# Altium schematic symbol library MCU_Microchip_ATmega.SchLib: 440 symbols (part 5 of 7)
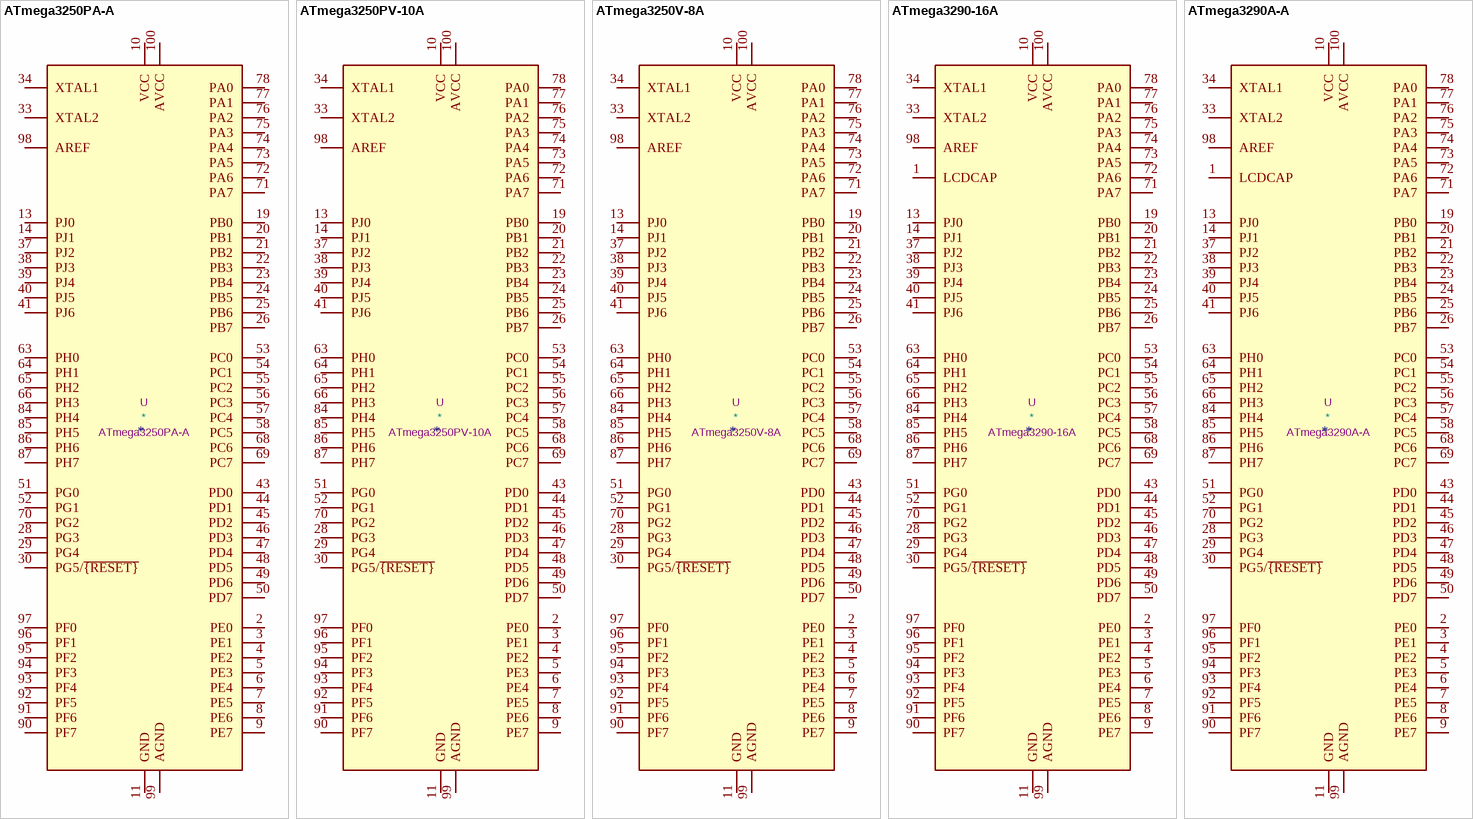
[diagram p44: symbols ATmega3250PA-A to ATmega3290A-A]

## ATmega3290A-A
designator *  value ATmega3290A-A  Reference: U
ki_keywords: AVR 8bit Microcontroller MegaAVR; ki_description: 20MHz, 32kB Flash, 2kB SRAM, 1kB EEPROM, JTAG, TQFP-100; ki_fp_filters: TQFP*14x14mm*P0.5mm*; Footprint: Package_QFP:TQFP-100_14x14mm_P0.5mm; Datasheet: http://ww1.microchip.com/downloads/en/DeviceDoc/atmel-8284-8-bit-avr-microcontroller-atmega169a_pa_329a_pa_3290a_pa_649a_p_6490a_p_datasheet.pdf
pins: 1 LCDCAP, 2 PE0, 3 PE1, 4 PE2, 5 PE3, 6 PE4, 7 PE5, 8 PE6, 9 PE7, 10 VCC, 11 GND, 12 NC hidden, 13 PJ0, 14 PJ1, 15 NC hidden, 16 NC hidden, 17 NC hidden, 18 NC hidden, 19 PB0, 20 PB1, 21 PB2, 22 PB3, 23 PB4, 24 PB5, 25 PB6, 26 PB7, 27 NC hidden, 28 PG3, 29 PG4, 30 PG5/~{{RESET}}, 31 VCC hidden, 32 GND hidden, 33 XTAL2, 34 XTAL1, 35 NC hidden, 36 NC hidden, 37 PJ2, 38 PJ3, 39 PJ4, 40 PJ5, 41 PJ6, 42 NC hidden, 43 PD0, 44 PD1, 45 PD2, 46 PD3, 47 PD4, 48 PD5, 49 PD6, 50 PD7, 51 PG0, 52 PG1, 53 PC0, 54 PC1, 55 PC2, 56 PC3, 57 PC4, 58 PC5, 59 NC hidden, 60 NC hidden, 61 NC hidden, 62 NC hidden, 63 PH0, 64 PH1, 65 PH2, 66 PH3, 67 NC hidden, 68 PC6, 69 PC7, 70 PG2, 71 PA7, 72 PA6, 73 PA5, 74 PA4, 75 PA3, 76 PA2, 77 PA1, 78 PA0, 79 NC hidden, 80 VCC hidden, 81 GND hidden, 82 NC hidden, 83 NC hidden, 84 PH4, 85 PH5, 86 PH6, 87 PH7, 88 NC hidden, 89 NC hidden, 90 PF7, 91 PF6, 92 PF5, 93 PF4, 94 PF3, 95 PF2, 96 PF1, 97 PF0, 98 AREF, 99 AGND, 100 AVCC

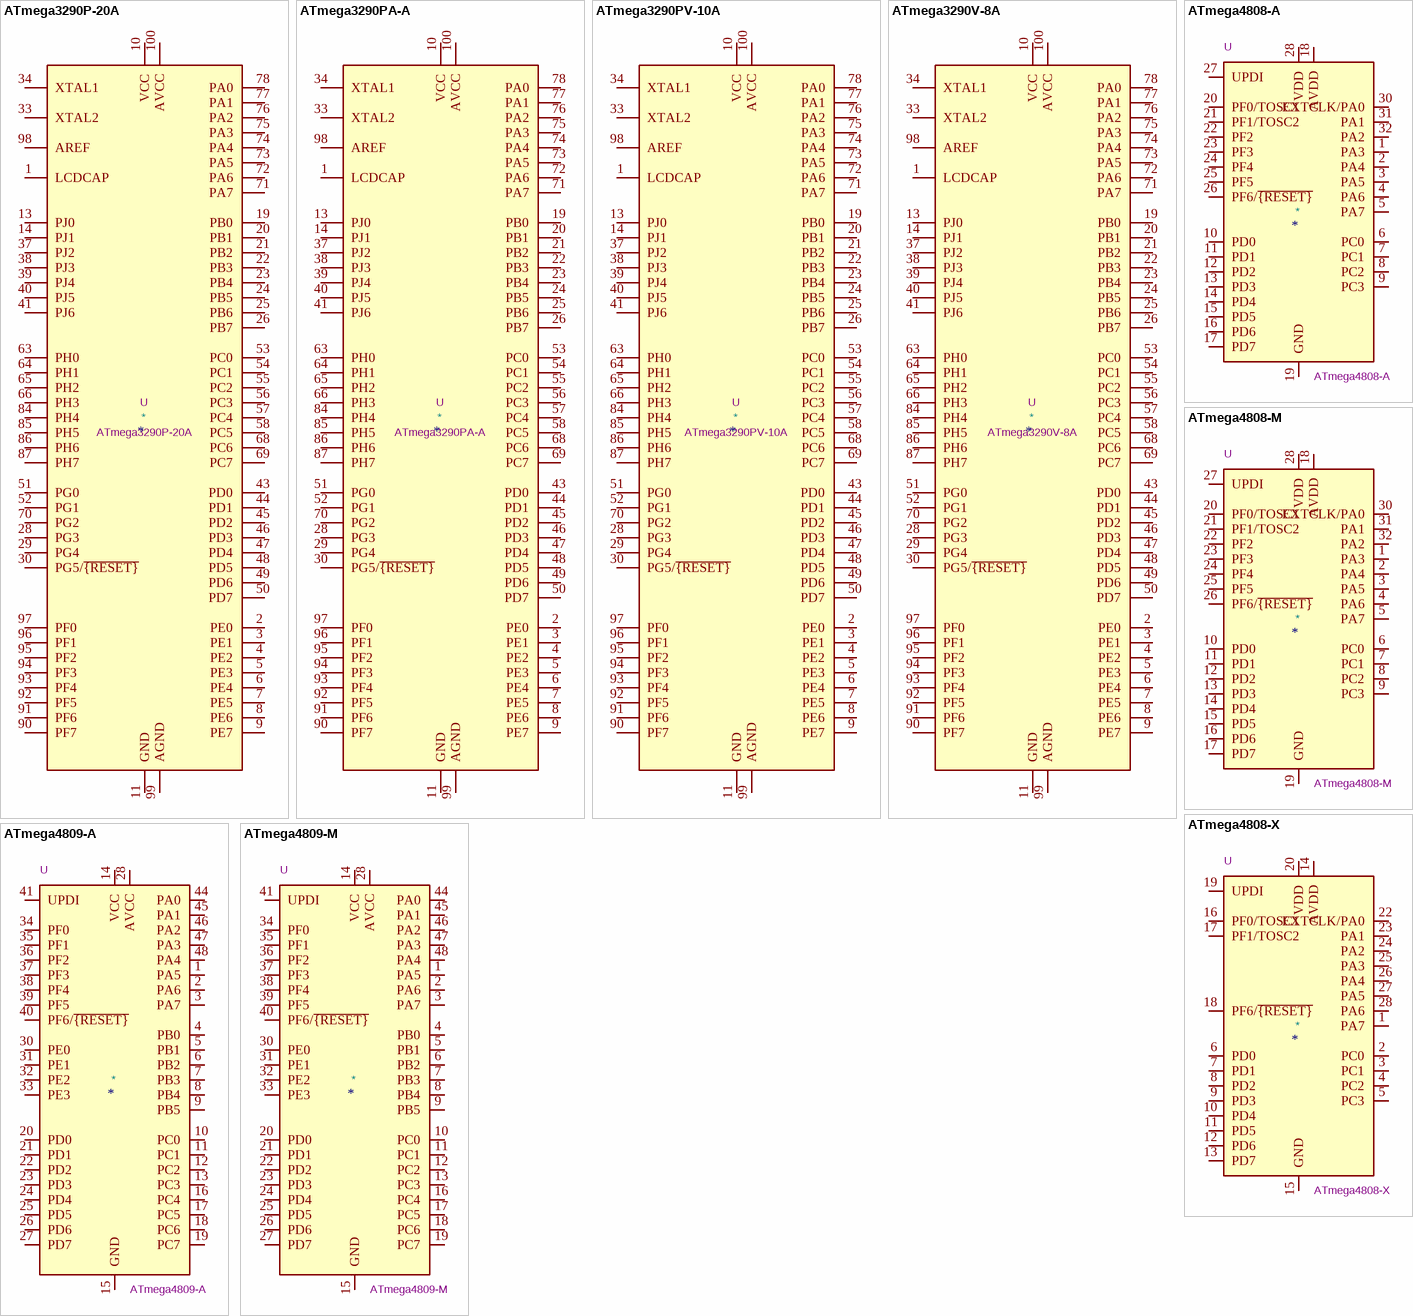
[diagram p27: symbols ATmega3290P-20A to ATmega4809-M]

## ATmega3290P-20A
designator *  value ATmega3290P-20A  Reference: U
ki_keywords: AVR 8bit Microcontroller MegaAVR; ki_description: 20MHz, 32kB Flash, 2kB SRAM, 1kB EEPROM, JTAG, TQFP-100; ki_fp_filters: TQFP*14x14mm*P0.5mm*; Footprint: Package_QFP:TQFP-100_14x14mm_P0.5mm; Datasheet: http://ww1.microchip.com/downloads/en/DeviceDoc/Atmel-8021-AVR-ATmega329P-3290P_Datasheet.pdf
pins: 1 LCDCAP, 2 PE0, 3 PE1, 4 PE2, 5 PE3, 6 PE4, 7 PE5, 8 PE6, 9 PE7, 10 VCC, 11 GND, 12 NC hidden, 13 PJ0, 14 PJ1, 15 NC hidden, 16 NC hidden, 17 NC hidden, 18 NC hidden, 19 PB0, 20 PB1, 21 PB2, 22 PB3, 23 PB4, 24 PB5, 25 PB6, 26 PB7, 27 NC hidden, 28 PG3, 29 PG4, 30 PG5/~{{RESET}}, 31 VCC hidden, 32 GND hidden, 33 XTAL2, 34 XTAL1, 35 NC hidden, 36 NC hidden, 37 PJ2, 38 PJ3, 39 PJ4, 40 PJ5, 41 PJ6, 42 NC hidden, 43 PD0, 44 PD1, 45 PD2, 46 PD3, 47 PD4, 48 PD5, 49 PD6, 50 PD7, 51 PG0, 52 PG1, 53 PC0, 54 PC1, 55 PC2, 56 PC3, 57 PC4, 58 PC5, 59 NC hidden, 60 NC hidden, 61 NC hidden, 62 NC hidden, 63 PH0, 64 PH1, 65 PH2, 66 PH3, 67 NC hidden, 68 PC6, 69 PC7, 70 PG2, 71 PA7, 72 PA6, 73 PA5, 74 PA4, 75 PA3, 76 PA2, 77 PA1, 78 PA0, 79 NC hidden, 80 VCC hidden, 81 GND hidden, 82 NC hidden, 83 NC hidden, 84 PH4, 85 PH5, 86 PH6, 87 PH7, 88 NC hidden, 89 NC hidden, 90 PF7, 91 PF6, 92 PF5, 93 PF4, 94 PF3, 95 PF2, 96 PF1, 97 PF0, 98 AREF, 99 AGND, 100 AVCC

## ATmega3290PA-A
designator *  value ATmega3290PA-A  Reference: U
ki_keywords: AVR 8bit Microcontroller MegaAVR; ki_description: 20MHz, 32kB Flash, 2kB SRAM, 1kB EEPROM, JTAG, TQFP-100; ki_fp_filters: TQFP*14x14mm*P0.5mm*; Footprint: Package_QFP:TQFP-100_14x14mm_P0.5mm; Datasheet: http://ww1.microchip.com/downloads/en/DeviceDoc/atmel-8284-8-bit-avr-microcontroller-atmega169a_pa_329a_pa_3290a_pa_649a_p_6490a_p_datasheet.pdf
pins: 1 LCDCAP, 2 PE0, 3 PE1, 4 PE2, 5 PE3, 6 PE4, 7 PE5, 8 PE6, 9 PE7, 10 VCC, 11 GND, 12 NC hidden, 13 PJ0, 14 PJ1, 15 NC hidden, 16 NC hidden, 17 NC hidden, 18 NC hidden, 19 PB0, 20 PB1, 21 PB2, 22 PB3, 23 PB4, 24 PB5, 25 PB6, 26 PB7, 27 NC hidden, 28 PG3, 29 PG4, 30 PG5/~{{RESET}}, 31 VCC hidden, 32 GND hidden, 33 XTAL2, 34 XTAL1, 35 NC hidden, 36 NC hidden, 37 PJ2, 38 PJ3, 39 PJ4, 40 PJ5, 41 PJ6, 42 NC hidden, 43 PD0, 44 PD1, 45 PD2, 46 PD3, 47 PD4, 48 PD5, 49 PD6, 50 PD7, 51 PG0, 52 PG1, 53 PC0, 54 PC1, 55 PC2, 56 PC3, 57 PC4, 58 PC5, 59 NC hidden, 60 NC hidden, 61 NC hidden, 62 NC hidden, 63 PH0, 64 PH1, 65 PH2, 66 PH3, 67 NC hidden, 68 PC6, 69 PC7, 70 PG2, 71 PA7, 72 PA6, 73 PA5, 74 PA4, 75 PA3, 76 PA2, 77 PA1, 78 PA0, 79 NC hidden, 80 VCC hidden, 81 GND hidden, 82 NC hidden, 83 NC hidden, 84 PH4, 85 PH5, 86 PH6, 87 PH7, 88 NC hidden, 89 NC hidden, 90 PF7, 91 PF6, 92 PF5, 93 PF4, 94 PF3, 95 PF2, 96 PF1, 97 PF0, 98 AREF, 99 AGND, 100 AVCC

## ATmega3290PV-10A
designator *  value ATmega3290PV-10A  Reference: U
ki_keywords: AVR 8bit Microcontroller MegaAVR; ki_description: 10MHz, 32kB Flash, 2kB SRAM, 1kB EEPROM, JTAG, TQFP-100; ki_fp_filters: TQFP*14x14mm*P0.5mm*; Footprint: Package_QFP:TQFP-100_14x14mm_P0.5mm; Datasheet: http://ww1.microchip.com/downloads/en/DeviceDoc/Atmel-8021-AVR-ATmega329P-3290P_Datasheet.pdf
pins: 1 LCDCAP, 2 PE0, 3 PE1, 4 PE2, 5 PE3, 6 PE4, 7 PE5, 8 PE6, 9 PE7, 10 VCC, 11 GND, 12 NC hidden, 13 PJ0, 14 PJ1, 15 NC hidden, 16 NC hidden, 17 NC hidden, 18 NC hidden, 19 PB0, 20 PB1, 21 PB2, 22 PB3, 23 PB4, 24 PB5, 25 PB6, 26 PB7, 27 NC hidden, 28 PG3, 29 PG4, 30 PG5/~{{RESET}}, 31 VCC hidden, 32 GND hidden, 33 XTAL2, 34 XTAL1, 35 NC hidden, 36 NC hidden, 37 PJ2, 38 PJ3, 39 PJ4, 40 PJ5, 41 PJ6, 42 NC hidden, 43 PD0, 44 PD1, 45 PD2, 46 PD3, 47 PD4, 48 PD5, 49 PD6, 50 PD7, 51 PG0, 52 PG1, 53 PC0, 54 PC1, 55 PC2, 56 PC3, 57 PC4, 58 PC5, 59 NC hidden, 60 NC hidden, 61 NC hidden, 62 NC hidden, 63 PH0, 64 PH1, 65 PH2, 66 PH3, 67 NC hidden, 68 PC6, 69 PC7, 70 PG2, 71 PA7, 72 PA6, 73 PA5, 74 PA4, 75 PA3, 76 PA2, 77 PA1, 78 PA0, 79 NC hidden, 80 VCC hidden, 81 GND hidden, 82 NC hidden, 83 NC hidden, 84 PH4, 85 PH5, 86 PH6, 87 PH7, 88 NC hidden, 89 NC hidden, 90 PF7, 91 PF6, 92 PF5, 93 PF4, 94 PF3, 95 PF2, 96 PF1, 97 PF0, 98 AREF, 99 AGND, 100 AVCC

## ATmega3290V-8A
designator *  value ATmega3290V-8A  Reference: U
ki_keywords: AVR 8bit Microcontroller MegaAVR; ki_description: 8MHz, 32kB Flash, 2kB SRAM, 1kB EEPROM, JTAG, TQFP-100; ki_fp_filters: TQFP*14x14mm*P0.5mm*; Footprint: Package_QFP:TQFP-100_14x14mm_P0.5mm; Datasheet: http://ww1.microchip.com/downloads/en/DeviceDoc/doc2552.pdf
pins: 1 LCDCAP, 2 PE0, 3 PE1, 4 PE2, 5 PE3, 6 PE4, 7 PE5, 8 PE6, 9 PE7, 10 VCC, 11 GND, 12 NC hidden, 13 PJ0, 14 PJ1, 15 NC hidden, 16 NC hidden, 17 NC hidden, 18 NC hidden, 19 PB0, 20 PB1, 21 PB2, 22 PB3, 23 PB4, 24 PB5, 25 PB6, 26 PB7, 27 NC hidden, 28 PG3, 29 PG4, 30 PG5/~{{RESET}}, 31 VCC hidden, 32 GND hidden, 33 XTAL2, 34 XTAL1, 35 NC hidden, 36 NC hidden, 37 PJ2, 38 PJ3, 39 PJ4, 40 PJ5, 41 PJ6, 42 NC hidden, 43 PD0, 44 PD1, 45 PD2, 46 PD3, 47 PD4, 48 PD5, 49 PD6, 50 PD7, 51 PG0, 52 PG1, 53 PC0, 54 PC1, 55 PC2, 56 PC3, 57 PC4, 58 PC5, 59 NC hidden, 60 NC hidden, 61 NC hidden, 62 NC hidden, 63 PH0, 64 PH1, 65 PH2, 66 PH3, 67 NC hidden, 68 PC6, 69 PC7, 70 PG2, 71 PA7, 72 PA6, 73 PA5, 74 PA4, 75 PA3, 76 PA2, 77 PA1, 78 PA0, 79 NC hidden, 80 VCC hidden, 81 GND hidden, 82 NC hidden, 83 NC hidden, 84 PH4, 85 PH5, 86 PH6, 87 PH7, 88 NC hidden, 89 NC hidden, 90 PF7, 91 PF6, 92 PF5, 93 PF4, 94 PF3, 95 PF2, 96 PF1, 97 PF0, 98 AREF, 99 AGND, 100 AVCC

## ATmega4808-A
designator *  value ATmega4808-A  Reference: U
ki_keywords: AVR 8bit Microcontroller MegaAVR; ki_description: 20MHz, 48kB Flash, 6kB SRAM, 256B EEPROM, TQFP-32; ki_fp_filters: TQFP*7x7mm*P0.8mm*; Footprint: Package_QFP:TQFP-32_7x7mm_P0.8mm; Datasheet: http://ww1.microchip.com/downloads/en/DeviceDoc/40002017A.pdf
pins: 1 PA3, 2 PA4, 3 PA5, 4 PA6, 5 PA7, 6 PC0, 7 PC1, 8 PC2, 9 PC3, 10 PD0, 11 PD1, 12 PD2, 13 PD3, 14 PD4, 15 PD5, 16 PD6, 17 PD7, 18 AVDD, 19 GND, 20 PF0/TOSC1, 21 PF1/TOSC2, 22 PF2, 23 PF3, 24 PF4, 25 PF5, 26 PF6/~{{RESET}}, 27 UPDI, 28 VDD, 29 GND hidden, 30 EXTCLK/PA0, 31 PA1, 32 PA2

## ATmega4808-M
designator *  value ATmega4808-M  Reference: U
ki_keywords: AVR 8bit Microcontroller MegaAVR; ki_description: 20MHz, 48kB Flash, 6kB SRAM, 256B EEPROM, VQFN-32; ki_fp_filters: QFN*1EP*5x5mm*P0.5mm*; Footprint: Package_DFN_QFN:QFN-32-1EP_5x5mm_P0.5mm_EP3.1x3.1mm_ThermalVias; Datasheet: http://ww1.microchip.com/downloads/en/DeviceDoc/40002017A.pdf
pins: 1 PA3, 2 PA4, 3 PA5, 4 PA6, 5 PA7, 6 PC0, 7 PC1, 8 PC2, 9 PC3, 10 PD0, 11 PD1, 12 PD2, 13 PD3, 14 PD4, 15 PD5, 16 PD6, 17 PD7, 18 AVDD, 19 GND, 20 PF0/TOSC1, 21 PF1/TOSC2, 22 PF2, 23 PF3, 24 PF4, 25 PF5, 26 PF6/~{{RESET}}, 27 UPDI, 28 VDD, 29 GND hidden, 30 EXTCLK/PA0, 31 PA1, 32 PA2, 33 GND hidden

## ATmega4808-X
designator *  value ATmega4808-X  Reference: U
ki_keywords: AVR 8bit Microcontroller MegaAVR; ki_description: 20MHz, 48kB Flash, 6kB SRAM, 256B EEPROM, SSOP-28; ki_fp_filters: SSOP*5.3x10.2mm*P0.65mm*; Footprint: Package_SO:SSOP-28_5.3x10.2mm_P0.65mm; Datasheet: http://ww1.microchip.com/downloads/en/DeviceDoc/40002018A.pdf
pins: 1 PA7, 2 PC0, 3 PC1, 4 PC2, 5 PC3, 6 PD0, 7 PD1, 8 PD2, 9 PD3, 10 PD4, 11 PD5, 12 PD6, 13 PD7, 14 AVDD, 15 GND, 16 PF0/TOSC1, 17 PF1/TOSC2, 18 PF6/~{{RESET}}, 19 UPDI, 20 VDD, 21 GND hidden, 22 EXTCLK/PA0, 23 PA1, 24 PA2, 25 PA3, 26 PA4, 27 PA5, 28 PA6

## ATmega4809-A
designator *  value ATmega4809-A  Reference: U
ki_keywords: AVR 8bit Microcontroller MegaAVR; ki_description: 20MHz, 48kB Flash, 6kB SRAM, 256B EEPROM, TQFP-48; ki_fp_filters: TQFP*7x7mm*P0.5mm*; Footprint: Package_QFP:TQFP-48_7x7mm_P0.5mm; Datasheet: http://ww1.microchip.com/downloads/en/DeviceDoc/40002016A.pdf
pins: 1 PA5, 2 PA6, 3 PA7, 4 PB0, 5 PB1, 6 PB2, 7 PB3, 8 PB4, 9 PB5, 10 PC0, 11 PC1, 12 PC2, 13 PC3, 14 VCC, 15 GND, 16 PC4, 17 PC5, 18 PC6, 19 PC7, 20 PD0, 21 PD1, 22 PD2, 23 PD3, 24 PD4, 25 PD5, 26 PD6, 27 PD7, 28 AVCC, 29 GND hidden, 30 PE0, 31 PE1, 32 PE2, 33 PE3, 34 PF0, 35 PF1, 36 PF2, 37 PF3, 38 PF4, 39 PF5, 40 PF6/~{{RESET}}, 41 UPDI, 42 VCC hidden, 43 GND hidden, 44 PA0, 45 PA1, 46 PA2, 47 PA3, 48 PA4

## ATmega4809-M
designator *  value ATmega4809-M  Reference: U
ki_keywords: AVR 8bit Microcontroller MegaAVR; ki_description: 20MHz, 48kB Flash, 6kB SRAM, 256B EEPROM, UQFN-48; ki_fp_filters: UQFN*1EP*6x6mm*P0.4mm*; Footprint: Package_DFN_QFN:UQFN-48-1EP_6x6mm_P0.4mm_EP4.62x4.62mm; Datasheet: http://ww1.microchip.com/downloads/en/DeviceDoc/40002016A.pdf
pins: 1 PA5, 2 PA6, 3 PA7, 4 PB0, 5 PB1, 6 PB2, 7 PB3, 8 PB4, 9 PB5, 10 PC0, 11 PC1, 12 PC2, 13 PC3, 14 VCC, 15 GND, 16 PC4, 17 PC5, 18 PC6, 19 PC7, 20 PD0, 21 PD1, 22 PD2, 23 PD3, 24 PD4, 25 PD5, 26 PD6, 27 PD7, 28 AVCC, 29 GND hidden, 30 PE0, 31 PE1, 32 PE2, 33 PE3, 34 PF0, 35 PF1, 36 PF2, 37 PF3, 38 PF4, 39 PF5, 40 PF6/~{{RESET}}, 41 UPDI, 42 VCC hidden, 43 GND hidden, 44 PA0, 45 PA1, 46 PA2, 47 PA3, 48 PA4, 49 GND hidden

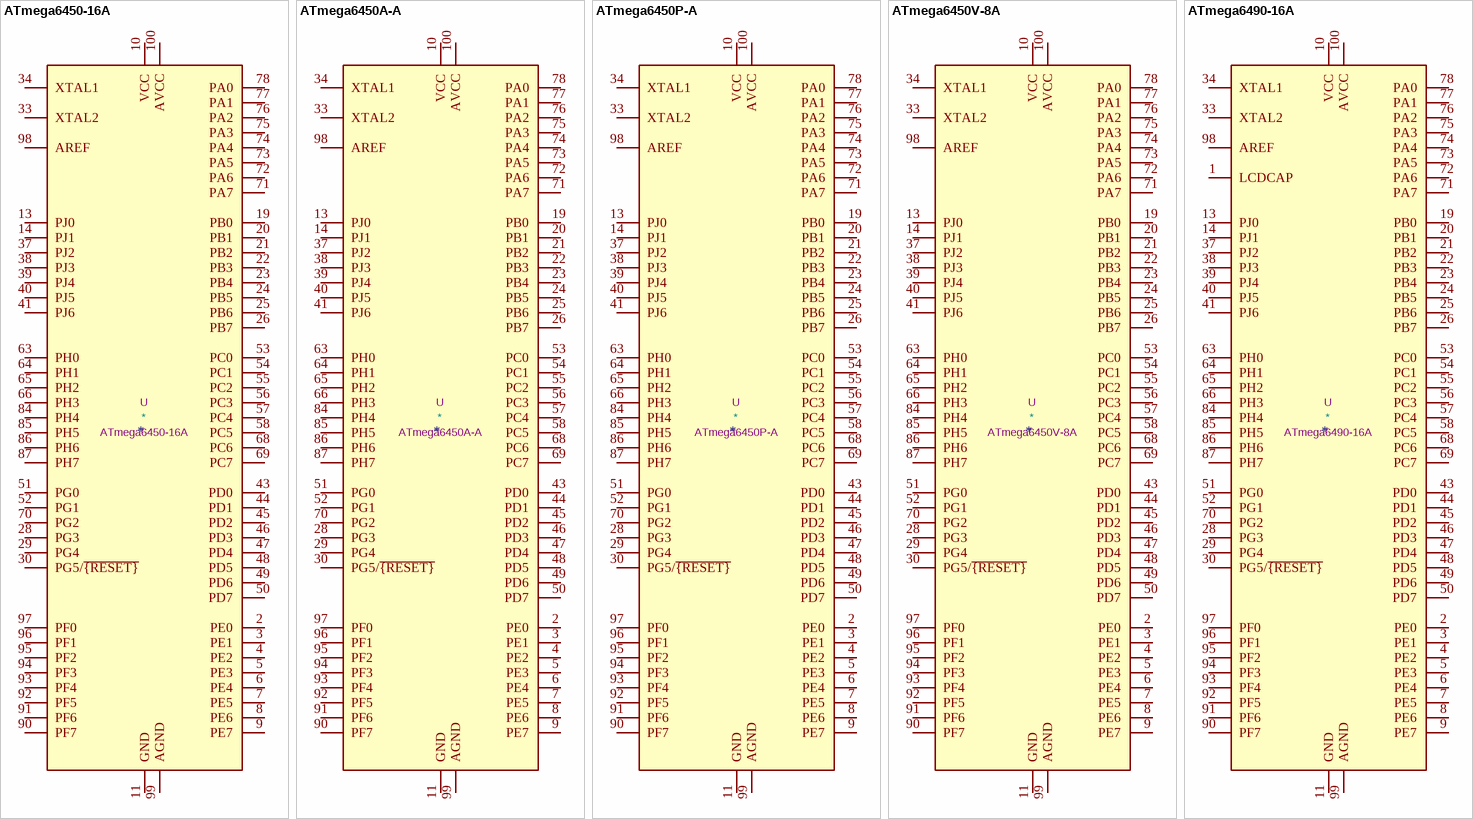
[diagram p28: symbols ATmega6450-16A to ATmega6490-16A]

## ATmega6450-16A
designator *  value ATmega6450-16A  Reference: U
ki_keywords: AVR 8bit Microcontroller MegaAVR; ki_description: 16MHz, 64kB Flash, 4kB SRAM, 2kB EEPROM, JTAG, TQFP-100; ki_fp_filters: TQFP*14x14mm*P0.5mm*; Footprint: Package_QFP:TQFP-100_14x14mm_P0.5mm; Datasheet: http://ww1.microchip.com/downloads/en/DeviceDoc/doc2570.pdf
pins: 1 NC hidden, 2 PE0, 3 PE1, 4 PE2, 5 PE3, 6 PE4, 7 PE5, 8 PE6, 9 PE7, 10 VCC, 11 GND, 12 NC hidden, 13 PJ0, 14 PJ1, 15 NC hidden, 16 NC hidden, 17 NC hidden, 18 NC hidden, 19 PB0, 20 PB1, 21 PB2, 22 PB3, 23 PB4, 24 PB5, 25 PB6, 26 PB7, 27 NC hidden, 28 PG3, 29 PG4, 30 PG5/~{{RESET}}, 31 VCC hidden, 32 GND hidden, 33 XTAL2, 34 XTAL1, 35 NC hidden, 36 NC hidden, 37 PJ2, 38 PJ3, 39 PJ4, 40 PJ5, 41 PJ6, 42 NC hidden, 43 PD0, 44 PD1, 45 PD2, 46 PD3, 47 PD4, 48 PD5, 49 PD6, 50 PD7, 51 PG0, 52 PG1, 53 PC0, 54 PC1, 55 PC2, 56 PC3, 57 PC4, 58 PC5, 59 NC hidden, 60 NC hidden, 61 NC hidden, 62 NC hidden, 63 PH0, 64 PH1, 65 PH2, 66 PH3, 67 NC hidden, 68 PC6, 69 PC7, 70 PG2, 71 PA7, 72 PA6, 73 PA5, 74 PA4, 75 PA3, 76 PA2, 77 PA1, 78 PA0, 79 NC hidden, 80 VCC hidden, 81 GND hidden, 82 NC hidden, 83 NC hidden, 84 PH4, 85 PH5, 86 PH6, 87 PH7, 88 NC hidden, 89 NC hidden, 90 PF7, 91 PF6, 92 PF5, 93 PF4, 94 PF3, 95 PF2, 96 PF1, 97 PF0, 98 AREF, 99 AGND, 100 AVCC

## ATmega6450A-A
designator *  value ATmega6450A-A  Reference: U
ki_keywords: AVR 8bit Microcontroller MegaAVR; ki_description: 20MHz, 64kB Flash, 4kB SRAM, 2kB EEPROM, JTAG, TQFP-100; ki_fp_filters: TQFP*14x14mm*P0.5mm*; Footprint: Package_QFP:TQFP-100_14x14mm_P0.5mm; Datasheet: http://ww1.microchip.com/downloads/en/DeviceDoc/atmel-8285-8-bit-avr-microcontroller-atmega165a_pa_325a_pa_3250a_pa_645a_p_6450a_p_datasheet.pdf
pins: 1 NC hidden, 2 PE0, 3 PE1, 4 PE2, 5 PE3, 6 PE4, 7 PE5, 8 PE6, 9 PE7, 10 VCC, 11 GND, 12 NC hidden, 13 PJ0, 14 PJ1, 15 NC hidden, 16 NC hidden, 17 NC hidden, 18 NC hidden, 19 PB0, 20 PB1, 21 PB2, 22 PB3, 23 PB4, 24 PB5, 25 PB6, 26 PB7, 27 NC hidden, 28 PG3, 29 PG4, 30 PG5/~{{RESET}}, 31 VCC hidden, 32 GND hidden, 33 XTAL2, 34 XTAL1, 35 NC hidden, 36 NC hidden, 37 PJ2, 38 PJ3, 39 PJ4, 40 PJ5, 41 PJ6, 42 NC hidden, 43 PD0, 44 PD1, 45 PD2, 46 PD3, 47 PD4, 48 PD5, 49 PD6, 50 PD7, 51 PG0, 52 PG1, 53 PC0, 54 PC1, 55 PC2, 56 PC3, 57 PC4, 58 PC5, 59 NC hidden, 60 NC hidden, 61 NC hidden, 62 NC hidden, 63 PH0, 64 PH1, 65 PH2, 66 PH3, 67 NC hidden, 68 PC6, 69 PC7, 70 PG2, 71 PA7, 72 PA6, 73 PA5, 74 PA4, 75 PA3, 76 PA2, 77 PA1, 78 PA0, 79 NC hidden, 80 VCC hidden, 81 GND hidden, 82 NC hidden, 83 NC hidden, 84 PH4, 85 PH5, 86 PH6, 87 PH7, 88 NC hidden, 89 NC hidden, 90 PF7, 91 PF6, 92 PF5, 93 PF4, 94 PF3, 95 PF2, 96 PF1, 97 PF0, 98 AREF, 99 AGND, 100 AVCC

## ATmega6450P-A
designator *  value ATmega6450P-A  Reference: U
ki_keywords: AVR 8bit Microcontroller MegaAVR; ki_description: 20MHz, 64kB Flash, 4kB SRAM, 2kB EEPROM, JTAG, TQFP-100; ki_fp_filters: TQFP*14x14mm*P0.5mm*; Footprint: Package_QFP:TQFP-100_14x14mm_P0.5mm; Datasheet: http://ww1.microchip.com/downloads/en/DeviceDoc/atmel-8285-8-bit-avr-microcontroller-atmega165a_pa_325a_pa_3250a_pa_645a_p_6450a_p_datasheet.pdf
pins: 1 NC hidden, 2 PE0, 3 PE1, 4 PE2, 5 PE3, 6 PE4, 7 PE5, 8 PE6, 9 PE7, 10 VCC, 11 GND, 12 NC hidden, 13 PJ0, 14 PJ1, 15 NC hidden, 16 NC hidden, 17 NC hidden, 18 NC hidden, 19 PB0, 20 PB1, 21 PB2, 22 PB3, 23 PB4, 24 PB5, 25 PB6, 26 PB7, 27 NC hidden, 28 PG3, 29 PG4, 30 PG5/~{{RESET}}, 31 VCC hidden, 32 GND hidden, 33 XTAL2, 34 XTAL1, 35 NC hidden, 36 NC hidden, 37 PJ2, 38 PJ3, 39 PJ4, 40 PJ5, 41 PJ6, 42 NC hidden, 43 PD0, 44 PD1, 45 PD2, 46 PD3, 47 PD4, 48 PD5, 49 PD6, 50 PD7, 51 PG0, 52 PG1, 53 PC0, 54 PC1, 55 PC2, 56 PC3, 57 PC4, 58 PC5, 59 NC hidden, 60 NC hidden, 61 NC hidden, 62 NC hidden, 63 PH0, 64 PH1, 65 PH2, 66 PH3, 67 NC hidden, 68 PC6, 69 PC7, 70 PG2, 71 PA7, 72 PA6, 73 PA5, 74 PA4, 75 PA3, 76 PA2, 77 PA1, 78 PA0, 79 NC hidden, 80 VCC hidden, 81 GND hidden, 82 NC hidden, 83 NC hidden, 84 PH4, 85 PH5, 86 PH6, 87 PH7, 88 NC hidden, 89 NC hidden, 90 PF7, 91 PF6, 92 PF5, 93 PF4, 94 PF3, 95 PF2, 96 PF1, 97 PF0, 98 AREF, 99 AGND, 100 AVCC

## ATmega6450V-8A
designator *  value ATmega6450V-8A  Reference: U
ki_keywords: AVR 8bit Microcontroller MegaAVR; ki_description: 8MHz, 64kB Flash, 4kB SRAM, 2kB EEPROM, JTAG, TQFP-100; ki_fp_filters: TQFP*14x14mm*P0.5mm*; Footprint: Package_QFP:TQFP-100_14x14mm_P0.5mm; Datasheet: http://ww1.microchip.com/downloads/en/DeviceDoc/doc2570.pdf
pins: 1 NC hidden, 2 PE0, 3 PE1, 4 PE2, 5 PE3, 6 PE4, 7 PE5, 8 PE6, 9 PE7, 10 VCC, 11 GND, 12 NC hidden, 13 PJ0, 14 PJ1, 15 NC hidden, 16 NC hidden, 17 NC hidden, 18 NC hidden, 19 PB0, 20 PB1, 21 PB2, 22 PB3, 23 PB4, 24 PB5, 25 PB6, 26 PB7, 27 NC hidden, 28 PG3, 29 PG4, 30 PG5/~{{RESET}}, 31 VCC hidden, 32 GND hidden, 33 XTAL2, 34 XTAL1, 35 NC hidden, 36 NC hidden, 37 PJ2, 38 PJ3, 39 PJ4, 40 PJ5, 41 PJ6, 42 NC hidden, 43 PD0, 44 PD1, 45 PD2, 46 PD3, 47 PD4, 48 PD5, 49 PD6, 50 PD7, 51 PG0, 52 PG1, 53 PC0, 54 PC1, 55 PC2, 56 PC3, 57 PC4, 58 PC5, 59 NC hidden, 60 NC hidden, 61 NC hidden, 62 NC hidden, 63 PH0, 64 PH1, 65 PH2, 66 PH3, 67 NC hidden, 68 PC6, 69 PC7, 70 PG2, 71 PA7, 72 PA6, 73 PA5, 74 PA4, 75 PA3, 76 PA2, 77 PA1, 78 PA0, 79 NC hidden, 80 VCC hidden, 81 GND hidden, 82 NC hidden, 83 NC hidden, 84 PH4, 85 PH5, 86 PH6, 87 PH7, 88 NC hidden, 89 NC hidden, 90 PF7, 91 PF6, 92 PF5, 93 PF4, 94 PF3, 95 PF2, 96 PF1, 97 PF0, 98 AREF, 99 AGND, 100 AVCC

## ATmega6490-16A
designator *  value ATmega6490-16A  Reference: U
ki_keywords: AVR 8bit Microcontroller MegaAVR; ki_description: 16MHz, 64kB Flash, 4kB SRAM, 2kB EEPROM, JTAG, TQFP-100; ki_fp_filters: TQFP*14x14mm*P0.5mm*; Footprint: Package_QFP:TQFP-100_14x14mm_P0.5mm; Datasheet: http://ww1.microchip.com/downloads/en/DeviceDoc/doc2552.pdf
pins: 1 LCDCAP, 2 PE0, 3 PE1, 4 PE2, 5 PE3, 6 PE4, 7 PE5, 8 PE6, 9 PE7, 10 VCC, 11 GND, 12 NC hidden, 13 PJ0, 14 PJ1, 15 NC hidden, 16 NC hidden, 17 NC hidden, 18 NC hidden, 19 PB0, 20 PB1, 21 PB2, 22 PB3, 23 PB4, 24 PB5, 25 PB6, 26 PB7, 27 NC hidden, 28 PG3, 29 PG4, 30 PG5/~{{RESET}}, 31 VCC hidden, 32 GND hidden, 33 XTAL2, 34 XTAL1, 35 NC hidden, 36 NC hidden, 37 PJ2, 38 PJ3, 39 PJ4, 40 PJ5, 41 PJ6, 42 NC hidden, 43 PD0, 44 PD1, 45 PD2, 46 PD3, 47 PD4, 48 PD5, 49 PD6, 50 PD7, 51 PG0, 52 PG1, 53 PC0, 54 PC1, 55 PC2, 56 PC3, 57 PC4, 58 PC5, 59 NC hidden, 60 NC hidden, 61 NC hidden, 62 NC hidden, 63 PH0, 64 PH1, 65 PH2, 66 PH3, 67 NC hidden, 68 PC6, 69 PC7, 70 PG2, 71 PA7, 72 PA6, 73 PA5, 74 PA4, 75 PA3, 76 PA2, 77 PA1, 78 PA0, 79 NC hidden, 80 VCC hidden, 81 GND hidden, 82 NC hidden, 83 NC hidden, 84 PH4, 85 PH5, 86 PH6, 87 PH7, 88 NC hidden, 89 NC hidden, 90 PF7, 91 PF6, 92 PF5, 93 PF4, 94 PF3, 95 PF2, 96 PF1, 97 PF0, 98 AREF, 99 AGND, 100 AVCC

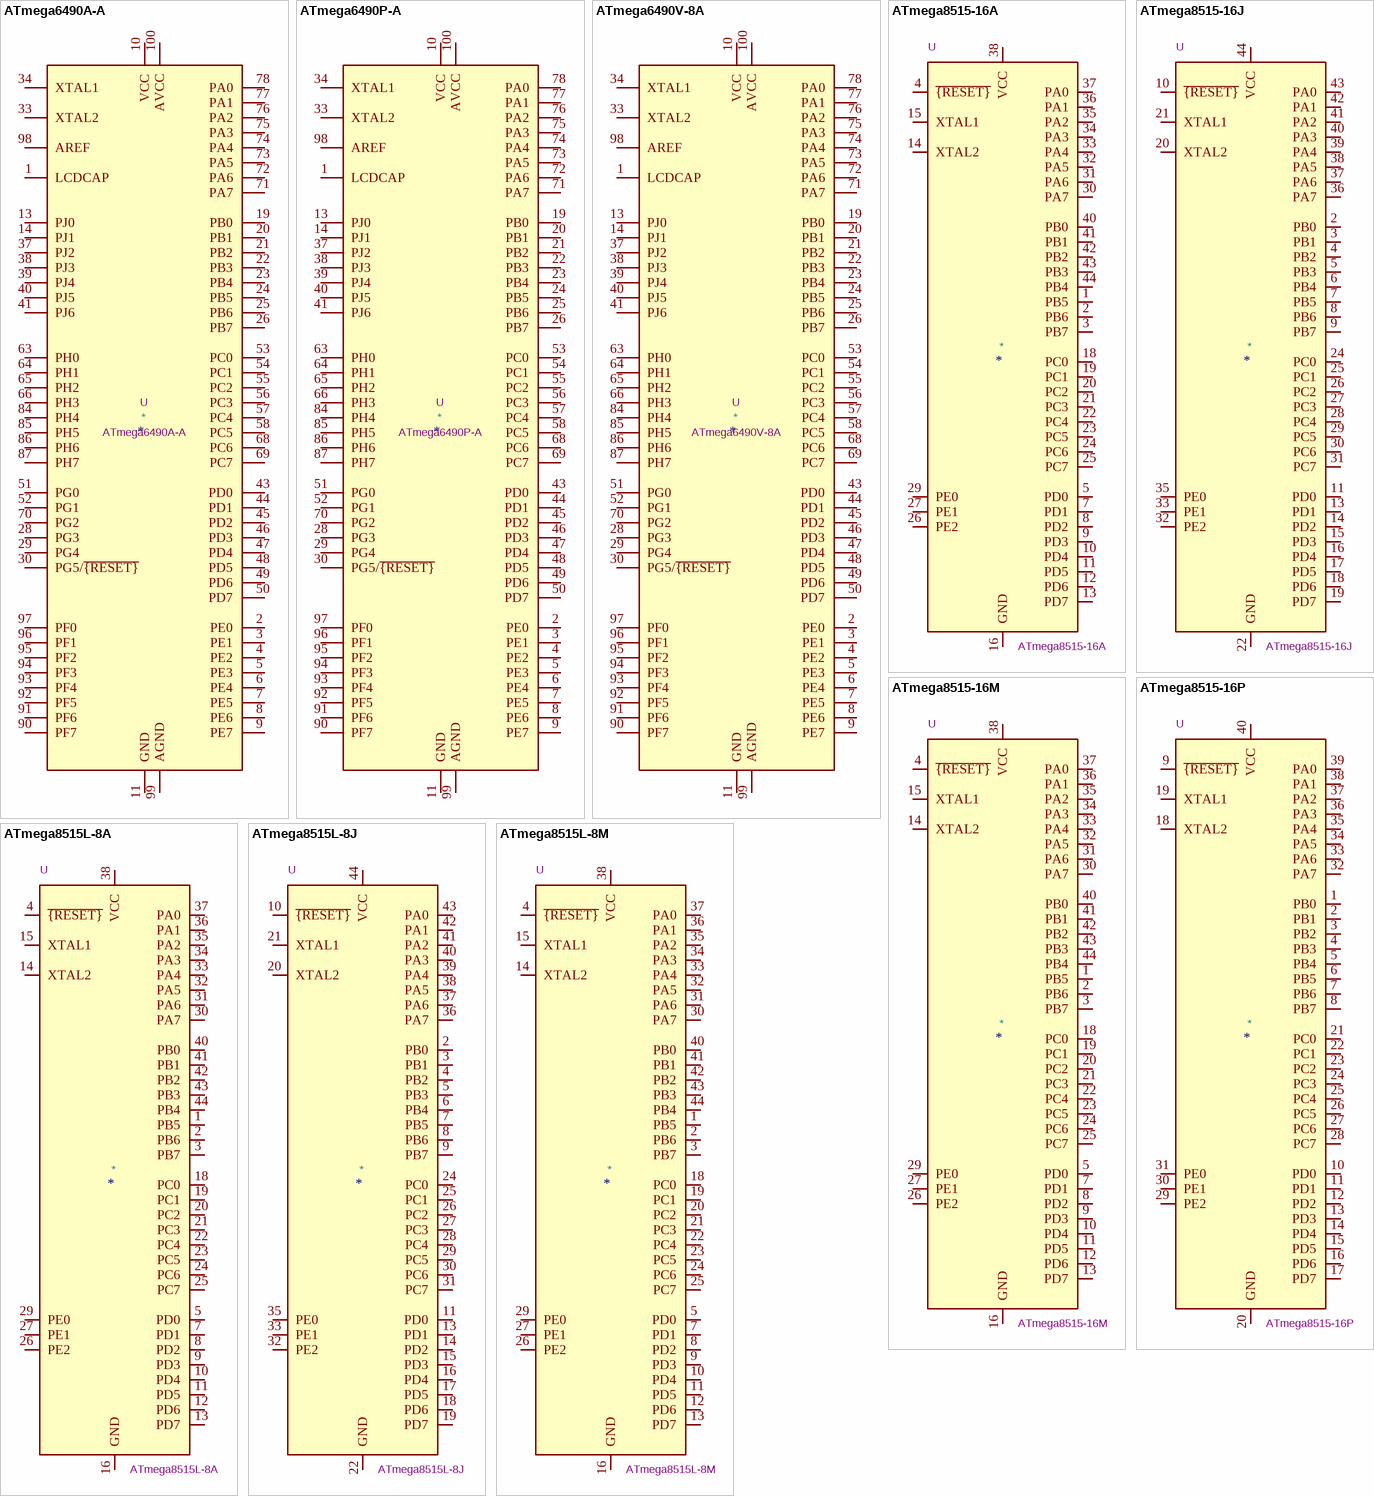
[diagram p29: symbols ATmega6490A-A to ATmega8515L-8M]

## ATmega6490A-A
designator *  value ATmega6490A-A  Reference: U
ki_keywords: AVR 8bit Microcontroller MegaAVR; ki_description: 20MHz, 64kB Flash, 4kB SRAM, 2kB EEPROM, JTAG, TQFP-100; ki_fp_filters: TQFP*14x14mm*P0.5mm*; Footprint: Package_QFP:TQFP-100_14x14mm_P0.5mm; Datasheet: http://ww1.microchip.com/downloads/en/DeviceDoc/atmel-8284-8-bit-avr-microcontroller-atmega169a_pa_329a_pa_3290a_pa_649a_p_6490a_p_datasheet.pdf
pins: 1 LCDCAP, 2 PE0, 3 PE1, 4 PE2, 5 PE3, 6 PE4, 7 PE5, 8 PE6, 9 PE7, 10 VCC, 11 GND, 12 NC hidden, 13 PJ0, 14 PJ1, 15 NC hidden, 16 NC hidden, 17 NC hidden, 18 NC hidden, 19 PB0, 20 PB1, 21 PB2, 22 PB3, 23 PB4, 24 PB5, 25 PB6, 26 PB7, 27 NC hidden, 28 PG3, 29 PG4, 30 PG5/~{{RESET}}, 31 VCC hidden, 32 GND hidden, 33 XTAL2, 34 XTAL1, 35 NC hidden, 36 NC hidden, 37 PJ2, 38 PJ3, 39 PJ4, 40 PJ5, 41 PJ6, 42 NC hidden, 43 PD0, 44 PD1, 45 PD2, 46 PD3, 47 PD4, 48 PD5, 49 PD6, 50 PD7, 51 PG0, 52 PG1, 53 PC0, 54 PC1, 55 PC2, 56 PC3, 57 PC4, 58 PC5, 59 NC hidden, 60 NC hidden, 61 NC hidden, 62 NC hidden, 63 PH0, 64 PH1, 65 PH2, 66 PH3, 67 NC hidden, 68 PC6, 69 PC7, 70 PG2, 71 PA7, 72 PA6, 73 PA5, 74 PA4, 75 PA3, 76 PA2, 77 PA1, 78 PA0, 79 NC hidden, 80 VCC hidden, 81 GND hidden, 82 NC hidden, 83 NC hidden, 84 PH4, 85 PH5, 86 PH6, 87 PH7, 88 NC hidden, 89 NC hidden, 90 PF7, 91 PF6, 92 PF5, 93 PF4, 94 PF3, 95 PF2, 96 PF1, 97 PF0, 98 AREF, 99 AGND, 100 AVCC

## ATmega6490P-A
designator *  value ATmega6490P-A  Reference: U
ki_keywords: AVR 8bit Microcontroller MegaAVR; ki_description: 20MHz, 64kB Flash, 4kB SRAM, 2kB EEPROM, JTAG, TQFP-100; ki_fp_filters: TQFP*14x14mm*P0.5mm*; Footprint: Package_QFP:TQFP-100_14x14mm_P0.5mm; Datasheet: http://ww1.microchip.com/downloads/en/DeviceDoc/atmel-8284-8-bit-avr-microcontroller-atmega169a_pa_329a_pa_3290a_pa_649a_p_6490a_p_datasheet.pdf
pins: 1 LCDCAP, 2 PE0, 3 PE1, 4 PE2, 5 PE3, 6 PE4, 7 PE5, 8 PE6, 9 PE7, 10 VCC, 11 GND, 12 NC hidden, 13 PJ0, 14 PJ1, 15 NC hidden, 16 NC hidden, 17 NC hidden, 18 NC hidden, 19 PB0, 20 PB1, 21 PB2, 22 PB3, 23 PB4, 24 PB5, 25 PB6, 26 PB7, 27 NC hidden, 28 PG3, 29 PG4, 30 PG5/~{{RESET}}, 31 VCC hidden, 32 GND hidden, 33 XTAL2, 34 XTAL1, 35 NC hidden, 36 NC hidden, 37 PJ2, 38 PJ3, 39 PJ4, 40 PJ5, 41 PJ6, 42 NC hidden, 43 PD0, 44 PD1, 45 PD2, 46 PD3, 47 PD4, 48 PD5, 49 PD6, 50 PD7, 51 PG0, 52 PG1, 53 PC0, 54 PC1, 55 PC2, 56 PC3, 57 PC4, 58 PC5, 59 NC hidden, 60 NC hidden, 61 NC hidden, 62 NC hidden, 63 PH0, 64 PH1, 65 PH2, 66 PH3, 67 NC hidden, 68 PC6, 69 PC7, 70 PG2, 71 PA7, 72 PA6, 73 PA5, 74 PA4, 75 PA3, 76 PA2, 77 PA1, 78 PA0, 79 NC hidden, 80 VCC hidden, 81 GND hidden, 82 NC hidden, 83 NC hidden, 84 PH4, 85 PH5, 86 PH6, 87 PH7, 88 NC hidden, 89 NC hidden, 90 PF7, 91 PF6, 92 PF5, 93 PF4, 94 PF3, 95 PF2, 96 PF1, 97 PF0, 98 AREF, 99 AGND, 100 AVCC

## ATmega6490V-8A
designator *  value ATmega6490V-8A  Reference: U
ki_keywords: AVR 8bit Microcontroller MegaAVR; ki_description: 8MHz, 64kB Flash, 4kB SRAM, 2kB EEPROM, JTAG, TQFP-100; ki_fp_filters: TQFP*14x14mm*P0.5mm*; Footprint: Package_QFP:TQFP-100_14x14mm_P0.5mm; Datasheet: http://ww1.microchip.com/downloads/en/DeviceDoc/doc2552.pdf
pins: 1 LCDCAP, 2 PE0, 3 PE1, 4 PE2, 5 PE3, 6 PE4, 7 PE5, 8 PE6, 9 PE7, 10 VCC, 11 GND, 12 NC hidden, 13 PJ0, 14 PJ1, 15 NC hidden, 16 NC hidden, 17 NC hidden, 18 NC hidden, 19 PB0, 20 PB1, 21 PB2, 22 PB3, 23 PB4, 24 PB5, 25 PB6, 26 PB7, 27 NC hidden, 28 PG3, 29 PG4, 30 PG5/~{{RESET}}, 31 VCC hidden, 32 GND hidden, 33 XTAL2, 34 XTAL1, 35 NC hidden, 36 NC hidden, 37 PJ2, 38 PJ3, 39 PJ4, 40 PJ5, 41 PJ6, 42 NC hidden, 43 PD0, 44 PD1, 45 PD2, 46 PD3, 47 PD4, 48 PD5, 49 PD6, 50 PD7, 51 PG0, 52 PG1, 53 PC0, 54 PC1, 55 PC2, 56 PC3, 57 PC4, 58 PC5, 59 NC hidden, 60 NC hidden, 61 NC hidden, 62 NC hidden, 63 PH0, 64 PH1, 65 PH2, 66 PH3, 67 NC hidden, 68 PC6, 69 PC7, 70 PG2, 71 PA7, 72 PA6, 73 PA5, 74 PA4, 75 PA3, 76 PA2, 77 PA1, 78 PA0, 79 NC hidden, 80 VCC hidden, 81 GND hidden, 82 NC hidden, 83 NC hidden, 84 PH4, 85 PH5, 86 PH6, 87 PH7, 88 NC hidden, 89 NC hidden, 90 PF7, 91 PF6, 92 PF5, 93 PF4, 94 PF3, 95 PF2, 96 PF1, 97 PF0, 98 AREF, 99 AGND, 100 AVCC

## ATmega8515-16A
designator *  value ATmega8515-16A  Reference: U
ki_keywords: AVR 8bit Microcontroller MegaAVR; ki_description: 16MHz, 8kB Flash, 512B SRAM, 512B EEPROM, TQFP-44; ki_fp_filters: TQFP*10x10mm*P0.8mm*; Footprint: Package_QFP:TQFP-44_10x10mm_P0.8mm; Datasheet: http://ww1.microchip.com/downloads/en/DeviceDoc/doc2512.pdf
pins: 1 PB5, 2 PB6, 3 PB7, 4 ~{{RESET}}, 5 PD0, 6 NC hidden, 7 PD1, 8 PD2, 9 PD3, 10 PD4, 11 PD5, 12 PD6, 13 PD7, 14 XTAL2, 15 XTAL1, 16 GND, 17 NC hidden, 18 PC0, 19 PC1, 20 PC2, 21 PC3, 22 PC4, 23 PC5, 24 PC6, 25 PC7, 26 PE2, 27 PE1, 28 NC hidden, 29 PE0, 30 PA7, 31 PA6, 32 PA5, 33 PA4, 34 PA3, 35 PA2, 36 PA1, 37 PA0, 38 VCC, 39 NC hidden, 40 PB0, 41 PB1, 42 PB2, 43 PB3, 44 PB4

## ATmega8515-16J
designator *  value ATmega8515-16J  Reference: U
ki_keywords: AVR 8bit Microcontroller MegaAVR; ki_description: 16MHz, 8kB Flash, 512B SRAM, 512B EEPROM, PLCC-44; ki_fp_filters: PLCC*; Footprint: Package_LCC:PLCC-44; Datasheet: http://ww1.microchip.com/downloads/en/DeviceDoc/doc2512.pdf
pins: 1 NC hidden, 2 PB0, 3 PB1, 4 PB2, 5 PB3, 6 PB4, 7 PB5, 8 PB6, 9 PB7, 10 ~{{RESET}}, 11 PD0, 12 NC hidden, 13 PD1, 14 PD2, 15 PD3, 16 PD4, 17 PD5, 18 PD6, 19 PD7, 20 XTAL2, 21 XTAL1, 22 GND, 23 NC hidden, 24 PC0, 25 PC1, 26 PC2, 27 PC3, 28 PC4, 29 PC5, 30 PC6, 31 PC7, 32 PE2, 33 PE1, 34 NC hidden, 35 PE0, 36 PA7, 37 PA6, 38 PA5, 39 PA4, 40 PA3, 41 PA2, 42 PA1, 43 PA0, 44 VCC

## ATmega8515-16M
designator *  value ATmega8515-16M  Reference: U
ki_keywords: AVR 8bit Microcontroller MegaAVR; ki_description: 16MHz, 8kB Flash, 512B SRAM, 512B EEPROM, QFN-44; ki_fp_filters: QFN*1EP*7x7mm*P0.5mm*; Footprint: Package_DFN_QFN:QFN-44-1EP_7x7mm_P0.5mm_EP5.2x5.2mm; Datasheet: http://ww1.microchip.com/downloads/en/DeviceDoc/doc2512.pdf
pins: 1 PB5, 2 PB6, 3 PB7, 4 ~{{RESET}}, 5 PD0, 6 NC hidden, 7 PD1, 8 PD2, 9 PD3, 10 PD4, 11 PD5, 12 PD6, 13 PD7, 14 XTAL2, 15 XTAL1, 16 GND, 17 NC hidden, 18 PC0, 19 PC1, 20 PC2, 21 PC3, 22 PC4, 23 PC5, 24 PC6, 25 PC7, 26 PE2, 27 PE1, 28 NC hidden, 29 PE0, 30 PA7, 31 PA6, 32 PA5, 33 PA4, 34 PA3, 35 PA2, 36 PA1, 37 PA0, 38 VCC, 39 NC hidden, 40 PB0, 41 PB1, 42 PB2, 43 PB3, 44 PB4, 45 GND hidden

## ATmega8515-16P
designator *  value ATmega8515-16P  Reference: U
ki_keywords: AVR 8bit Microcontroller MegaAVR; ki_description: 16MHz, 8kB Flash, 512B SRAM, 512B EEPROM, DIP-40; ki_fp_filters: DIP*W15.24mm*; Footprint: Package_DIP:DIP-40_W15.24mm; Datasheet: http://ww1.microchip.com/downloads/en/DeviceDoc/doc2512.pdf
pins: 1 PB0, 2 PB1, 3 PB2, 4 PB3, 5 PB4, 6 PB5, 7 PB6, 8 PB7, 9 ~{{RESET}}, 10 PD0, 11 PD1, 12 PD2, 13 PD3, 14 PD4, 15 PD5, 16 PD6, 17 PD7, 18 XTAL2, 19 XTAL1, 20 GND, 21 PC0, 22 PC1, 23 PC2, 24 PC3, 25 PC4, 26 PC5, 27 PC6, 28 PC7, 29 PE2, 30 PE1, 31 PE0, 32 PA7, 33 PA6, 34 PA5, 35 PA4, 36 PA3, 37 PA2, 38 PA1, 39 PA0, 40 VCC

## ATmega8515L-8A
designator *  value ATmega8515L-8A  Reference: U
ki_keywords: AVR 8bit Microcontroller MegaAVR; ki_description: 8MHz, 8kB Flash, 512B SRAM, 512B EEPROM, TQFP-44; ki_fp_filters: TQFP*10x10mm*P0.8mm*; Footprint: Package_QFP:TQFP-44_10x10mm_P0.8mm; Datasheet: http://ww1.microchip.com/downloads/en/DeviceDoc/doc2512.pdf
pins: 1 PB5, 2 PB6, 3 PB7, 4 ~{{RESET}}, 5 PD0, 6 NC hidden, 7 PD1, 8 PD2, 9 PD3, 10 PD4, 11 PD5, 12 PD6, 13 PD7, 14 XTAL2, 15 XTAL1, 16 GND, 17 NC hidden, 18 PC0, 19 PC1, 20 PC2, 21 PC3, 22 PC4, 23 PC5, 24 PC6, 25 PC7, 26 PE2, 27 PE1, 28 NC hidden, 29 PE0, 30 PA7, 31 PA6, 32 PA5, 33 PA4, 34 PA3, 35 PA2, 36 PA1, 37 PA0, 38 VCC, 39 NC hidden, 40 PB0, 41 PB1, 42 PB2, 43 PB3, 44 PB4

## ATmega8515L-8J
designator *  value ATmega8515L-8J  Reference: U
ki_keywords: AVR 8bit Microcontroller MegaAVR; ki_description: 8MHz, 8kB Flash, 512B SRAM, 512B EEPROM, PLCC-44; ki_fp_filters: PLCC*; Footprint: Package_LCC:PLCC-44; Datasheet: http://ww1.microchip.com/downloads/en/DeviceDoc/doc2512.pdf
pins: 1 NC hidden, 2 PB0, 3 PB1, 4 PB2, 5 PB3, 6 PB4, 7 PB5, 8 PB6, 9 PB7, 10 ~{{RESET}}, 11 PD0, 12 NC hidden, 13 PD1, 14 PD2, 15 PD3, 16 PD4, 17 PD5, 18 PD6, 19 PD7, 20 XTAL2, 21 XTAL1, 22 GND, 23 NC hidden, 24 PC0, 25 PC1, 26 PC2, 27 PC3, 28 PC4, 29 PC5, 30 PC6, 31 PC7, 32 PE2, 33 PE1, 34 NC hidden, 35 PE0, 36 PA7, 37 PA6, 38 PA5, 39 PA4, 40 PA3, 41 PA2, 42 PA1, 43 PA0, 44 VCC

## ATmega8515L-8M
designator *  value ATmega8515L-8M  Reference: U
ki_keywords: AVR 8bit Microcontroller MegaAVR; ki_description: 8MHz, 8kB Flash, 512B SRAM, 512B EEPROM, QFN-44; ki_fp_filters: QFN*1EP*7x7mm*P0.5mm*; Footprint: Package_DFN_QFN:QFN-44-1EP_7x7mm_P0.5mm_EP5.2x5.2mm; Datasheet: http://ww1.microchip.com/downloads/en/DeviceDoc/doc2512.pdf
pins: 1 PB5, 2 PB6, 3 PB7, 4 ~{{RESET}}, 5 PD0, 6 NC hidden, 7 PD1, 8 PD2, 9 PD3, 10 PD4, 11 PD5, 12 PD6, 13 PD7, 14 XTAL2, 15 XTAL1, 16 GND, 17 NC hidden, 18 PC0, 19 PC1, 20 PC2, 21 PC3, 22 PC4, 23 PC5, 24 PC6, 25 PC7, 26 PE2, 27 PE1, 28 NC hidden, 29 PE0, 30 PA7, 31 PA6, 32 PA5, 33 PA4, 34 PA3, 35 PA2, 36 PA1, 37 PA0, 38 VCC, 39 NC hidden, 40 PB0, 41 PB1, 42 PB2, 43 PB3, 44 PB4, 45 GND hidden
